# Altium footprint library MCBoard_pcb.PcbLib: 78 footprints (part 3 of 5)
Each footprint in its own frame and in the unit in brackets; x right, y up, seen from the top. Pads: shape width x height; smd on the part's side, far side on the other; paste and mask are expansions set on the pad; w line width, h text height; cw(c..) or ccw(c..) is an arc to the next point about the centre after c.
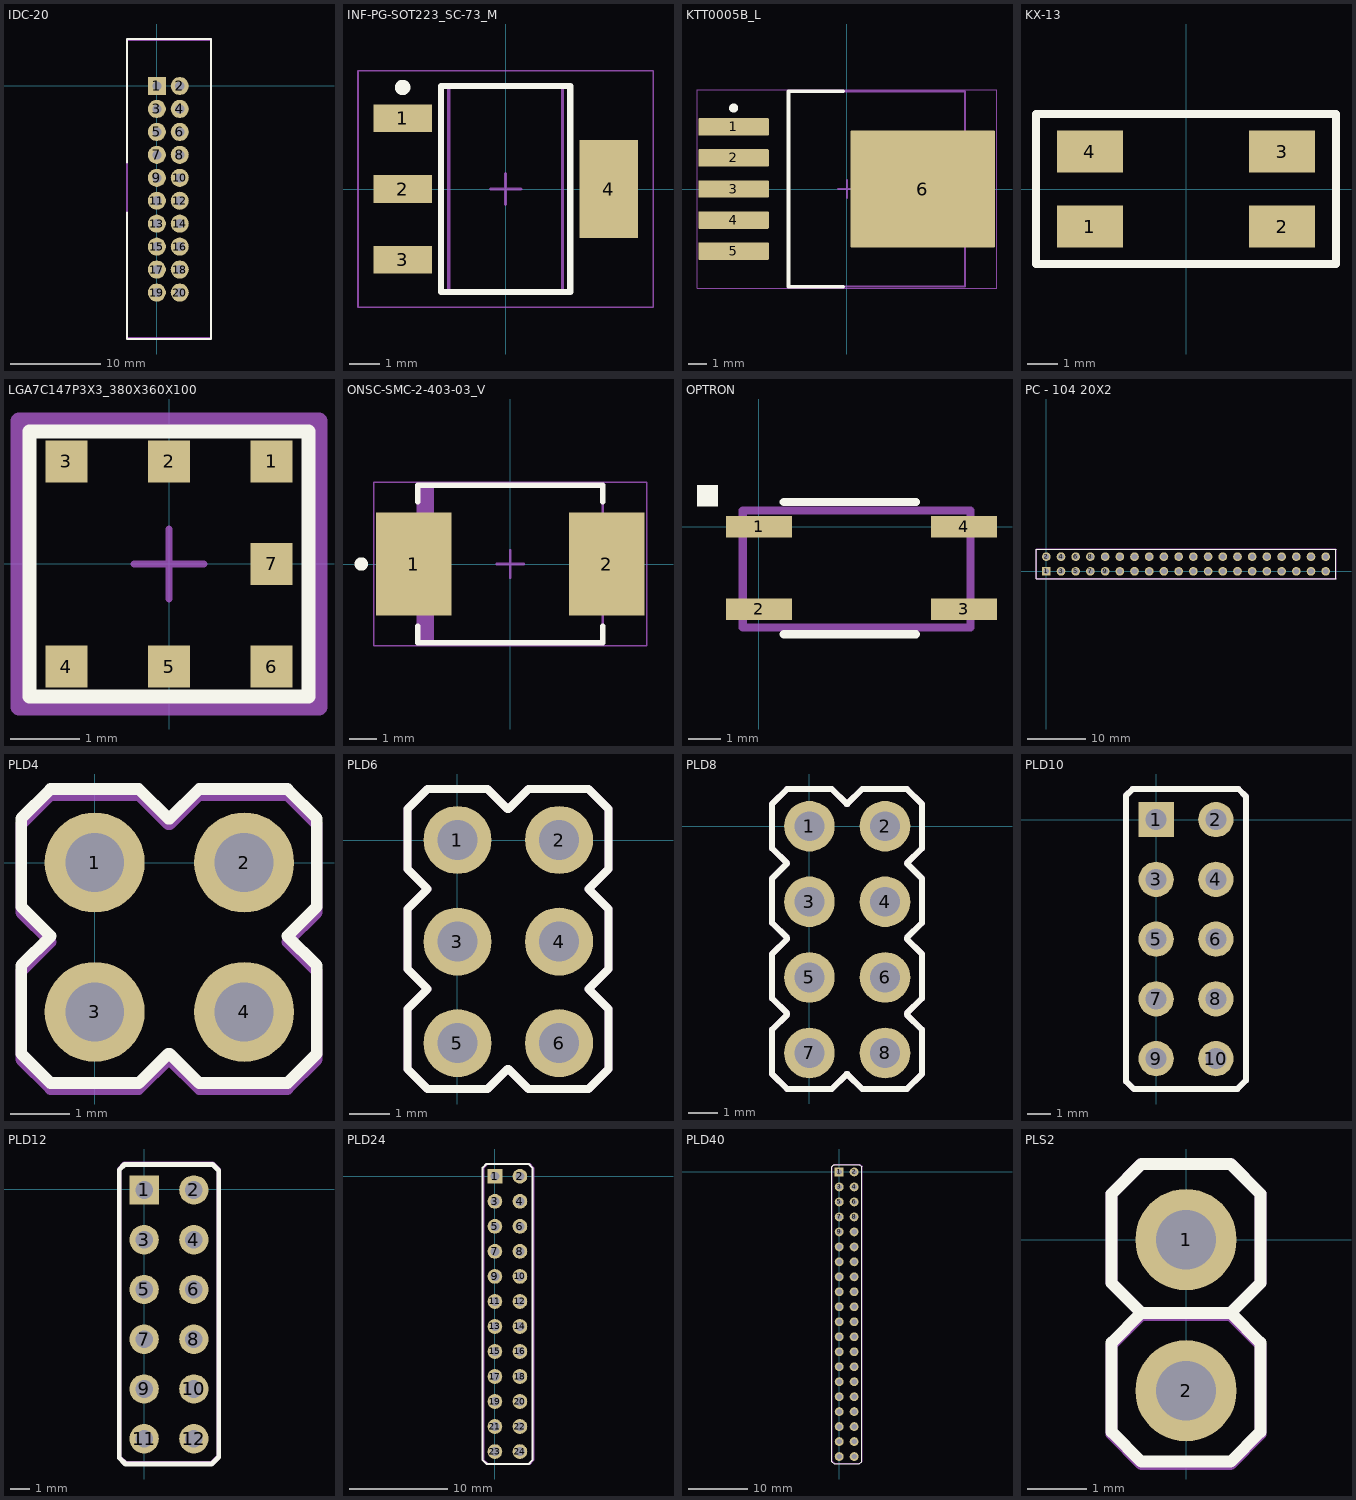
[diagram p2: the footprints below, top view; thin cyan lines are the x and y axes]

## IDC-20 [mm] "IDC-20 Male Connector"
height 9
pads (20):
  rect 2x2 hole 1: 1(0,0)
  round 2 hole 1: 2(2.54,0) 3(0,-2.54) 4(2.54,-2.54) 5(0,-5.08) 6(2.54,-5.08) 7(0,-7.62) 8(2.54,-7.62) 9(0,-10.16) 10(2.54,-10.16) 11(0,-12.7) 12(2.54,-12.7) 13(0,-15.24) 14(2.54,-15.24) 15(0,-17.78) 16(2.54,-17.78) 17(0,-20.32) 18(2.54,-20.32) 19(0,-22.86) 20(2.54,-22.86)
Top Overlay:
  lines w0.2: -3.3,-14 -3.3,-28 6,-28 6,5.2 -3.3,5.2 -3.3,-8.5
Pattern top:
  lines w0.2: -3.3,-27.9 6,-27.9 6,5.2 5.9,5.1 -3.3,5.1 -3.3,-27.9
  text ".Designator" at -3.2,2.3 h2.13
3D body "User Library-BH-10__64BH-20.STEP": height 9.1, standoff -3, extent -3.3,-28 6,5.2

## INF-PG-SOT223_SC-73_M [mm] "SOT223, 4-Leads, Body 6.5x3.5mm, Pitch 2.3mm, IPC Low Density"
height 1.8
pads (4):
  rect 1.9x0.9 smd: 1(-3.35,2.3) 2(-3.35,0) 3(-3.35,-2.3)
  rect 1.9x3.2 smd: 4(3.35,0)
Top Overlay:
  circle w0.25: c-3.35,3.3 r0.125
  lines w0.2: -2.1,-3.35 -2.1,3.35 2.1,3.35 2.1,-3.35 -2.1,-3.35
Mechanical 13:
  lines w0.1: -1.85,-3.35 -1.85,3.35 1.85,3.35 1.85,-3.35 -1.85,-3.35
Mechanical 15:
  lines w0.05: -4.8,-3.85 -4.8,3.85 4.8,3.85 4.8,-3.85 -4.8,-3.85
  lines w0.1: -0.5,0 0.5,0 ; 0,-0.5 0,0.5
3D body: height 1.8, standoff 0.1, extent -1.85,-3.35 1.85,3.35

## KTT0005B_L [mm] "DPAK, 5-Leads, Body 10.65x9.65mm, Pitch 1.7mm, IPC High Density"
height 4.83
pads (6):
  rrect11% 3.85x0.95 smd: 1(-6.2,3.4) 2(-6.2,1.7) 3(-6.2,0) 4(-6.2,-1.7) 5(-6.2,-3.4)
  rrect2% 7.9x6.4 smd: 6(4.15,0)
Top Overlay:
  circle w0.25: c-6.2,4.425 r0.125
  lines w0.2: -0.2,-5.35 -3.2,-5.35 -3.2,5.35 -0.2,5.35
Template:
  text ".Designator" at -1.905,-0.508 h1.3
Mechanical 13:
  lines w0.1: -3.2,-5.325 6.45,-5.325 6.45,5.325 -3.2,5.325 -3.2,-5.325
Mechanical 15:
  lines w0.05: -8.2,-5.425 8.2,-5.425 8.2,5.425 -8.2,5.425 -8.2,-5.425
  lines w0.1: -0.5,0 0.5,0 ; 0,-0.5 0,0.5
3D body: height 4.83, standoff 0, extent -3.2,-5.325 6.45,5.325

## KX-13 [mm]
pads (4):
  rect 2.2x1.4 smd: 1(-3.2,-1.25) 2(3.2,-1.25) 3(3.2,1.25) 4(-3.2,1.25)
Top Overlay:
  lines w0.254: -5,-2.5 5,-2.5 5,2.5 -5,2.5 -5,-2.5
Pattern top:
  lines w0.25: -5,-2.5 -5,2.5 5,2.5 5,-2.5 -5,-2.5
  text ".Designator" at -4.4,3.4 h2.13
3D body "User Library-KX-13 7,37280.STEP": height 1.29, standoff -0.01, extent -3.5,-2.6 3.5,2.4

## LGA7C147P3X3_380X360X100 [mm] "LGA, 7-Leads, Body 3,80x3,60mmx1,00mm, Pitch 1,47mm"
height 1
pads (7):
  rect 0.6x0.6 smd: 1(1.47,1.47) 2(0,1.47) 3(-1.47,1.47) 4(-1.47,-1.47) 5(0,-1.47) 6(1.47,-1.47) 7(1.47,0)
Top Overlay:
  lines w0.2: -2,-1.9 -2,1.9 2,1.9 2,-1.9 -2,-1.9
Pattern top:
  lines w0.1: -0.5,0 0.5,0 ; 0,-0.5 0,0.5
  lines w0.25: -2.15,-2.05 2.15,-2.05 2.15,2.05 -2.15,2.05 -2.15,-2.05
  text ".Designator" at -1.2,3 h2.13
3D body "LGA7C147P3X3_380X360X100.step": height 1, standoff 0, extent -1.95,-1.85 1.95,1.85

## ONSC-SMC-2-403-03_V [mil] "Molded, 2-Leads, Body 6.86x5.84mm"
height 99.02
pads (2):
  rect 110x150 smd: 1(-140.49,0) 2(140.49,0)
Top Overlay:
  circle w9.84: c-217.15,0 r4.92
  lines w7.87: -135.04,-90.75 -135.04,-114.96 135.04,-114.96 135.04,-90.75 ; -135.04,90.75 -135.04,114.96 135.04,114.96 135.04,90.75
Mechanical 13:
  rectangle: -135.45,-114.96 -111.25,114.96
  lines w3.94: -135.04,-114.96 135.04,-114.96 135.04,114.96 -135.04,114.96 -135.04,-114.96
Mechanical 15:
  lines w1.97: -199.43,-118.9 199.43,-118.9 199.43,118.9 -199.43,118.9 -199.43,-118.9
  lines w3.94: -19.68,0 19.69,0 ; 0,-19.68 0,19.68
3D body: height 99.02, standoff 1.97, extent -135.04,-114.96 135.04,114.96

## OPTRON [mil]
pads (4):
  rect 80x26 smd: 1(0,0) 2(0,-100) 3(248.03,-100) 4(248.03,0)
Top Overlay:
  region: -75,25 -50,25 -50,50 -75,50
  lines w10: 30,-130 190,-130 ; 30,30 190,30
Pattern top:
  lines w9.84: -19.68,-122.05 -19.68,19.68 255.91,19.68 255.91,-122.05 -19.68,-122.05
  text ".Designator" at -11.81,66.93 h83.86
3D body "User Library-HCPL-181-1.STEP": height 78.74, standoff -3.96, extent -19.68,-122.05 255.91,19.69

## PC - 104 20X2 [mm] "Connector; Header; 20x2 Position"
height 11.1
pads (40):
  rect 1.5x1.5 hole 1: 1(0,0)
  round 1.5 hole 1: 2(0,2.54) 3(2.54,0) 4(2.54,2.54) 5(5.08,0) 6(5.08,2.54) 7(7.62,0) 8(7.62,2.54) 9(10.16,0) 10(10.16,2.54) 11(12.7,0) 12(12.7,2.54) 13(15.24,0) 14(15.24,2.54) 15(17.78,0) 16(17.78,2.54) 17(20.32,0) 18(20.32,2.54) 19(22.86,0) 20(22.86,2.54) 21(25.4,0) 22(25.4,2.54) 23(27.94,0) 24(27.94,2.54) 25(30.48,0) 26(30.48,2.54) 27(33.02,0) 28(33.02,2.54) 29(35.56,0) 30(35.56,2.54) 31(38.1,0) 32(38.1,2.54) 33(40.64,0) 34(40.64,2.54) 35(43.18,0) 36(43.18,2.54) 37(45.72,0) 38(45.72,2.54) 39(48.26,0) 40(48.26,2.54)
Top Overlay:
  lines w0.2: -1.78,-1.27 50.04,-1.27 ; -1.78,3.81 50.04,3.81 ; -1.778,-1.27 -1.778,3.81 ; 50.038,-1.27 50.038,3.81
Bottom Overlay:
  lines w0.2: -1.78,-1.27 50.04,-1.27 ; -1.78,3.81 50.04,3.81 ; -1.778,-1.27 -1.778,3.81 ; 50.038,-1.27 50.038,3.81
Pattern top:
  lines w0.25: -1.78,-1.27 -1.78,3.81 50.038,3.81 50.038,-1.27 -1.78,-1.27
  text ".Designator" at 18.2,5.8 h2.13
3D body "pc104-40 тип 2.STEP": height 11.05, standoff -12.2, extent -1.52,-1.205 49.78,3.745

## PLD4 [mm]
pads (4):
  round 1.7 hole 1 paste+0: 1(0,0) 2(2.54,0) 3(0,-2.54) 4(2.54,-2.54)
Top Overlay:
  lines w0.2: 1.25,-3.25 0.75,-3.75 -0.75,-3.75 -1.25,-3.25 -1.25,-1.75 -0.75,-1.25 -1.25,-0.75 -1.25,0.75 -0.75,1.25 0.75,1.25 1.25,0.75 ; 1.275,-3.25 1.775,-3.75 3.275,-3.75 3.775,-3.25 3.775,-1.75 3.275,-1.25 3.775,-0.75 3.775,0.75 3.275,1.25 1.775,1.25 1.275,0.75
Pattern top:
  lines w0.2: 1.25,-3.35 0.75,-3.85 -0.75,-3.85 -1.25,-3.35 -1.25,-1.85 -0.75,-1.35 -1.25,-0.85 -1.25,0.65 -0.75,1.15 0.75,1.15 1.25,0.65 ; 1.275,-3.35 1.775,-3.85 3.275,-3.85 3.775,-3.35 3.775,-1.85 3.275,-1.35 3.775,-0.85 3.775,0.65 3.275,1.15 1.775,1.15 1.275,0.65
  text ".Designator" at -2.9,1.8 h2.13
3D body "User Library-PLS-1.STEP": height 8.44, standoff -3, extent 1.27,-3.81 3.81,-1.27
3D body "User Library-PLS-1.STEP": height 8.44, standoff -3, extent -1.27,-3.81 1.27,-1.27
3D body "User Library-PLS-1.STEP": height 8.44, standoff -3, extent 1.27,-1.27 3.81,1.27
3D body "User Library-PLS-1.STEP": height 8.44, standoff -3, extent -1.27,-1.27 1.27,1.27

## PLD6 [mm]
pads (6):
  round 1.7 hole 1 paste+0: 1(0,0) 2(2.54,0) 3(0,-2.54) 4(2.54,-2.54) 5(0,-5.08) 6(2.54,-5.08)
Top Overlay:
  lines w0.2: 1.25,-5.725 0.75,-6.225 -0.75,-6.225 -1.25,-5.725 -1.25,-4.225 -0.75,-3.725 -1.25,-3.225 -1.25,-1.725 -0.75,-1.225 -1.25,-0.725 -1.25,0.775 -0.75,1.275 0.75,1.275 1.25,0.775 ; 1.275,-5.725 1.775,-6.225 3.275,-6.225 3.775,-5.725 3.775,-4.225 3.275,-3.725 3.775,-3.225 3.775,-1.725 3.275,-1.225 3.775,-0.725 3.775,0.775 3.275,1.275 1.775,1.275 1.275,0.775
Pattern top:
  lines w0.2: 1.25,-5.725 0.75,-6.225 -0.75,-6.225 -1.25,-5.725 -1.25,-4.225 -0.75,-3.725 -1.25,-3.225 -1.25,-1.725 -0.75,-1.225 -1.25,-0.725 -1.25,0.775 -0.75,1.275 0.75,1.275 1.25,0.775 ; 1.275,-5.725 1.775,-6.225 3.275,-6.225 3.775,-5.725 3.775,-4.225 3.275,-3.725 3.775,-3.225 3.775,-1.725 3.275,-1.225 3.775,-0.725 3.775,0.775 3.275,1.275 1.775,1.275 1.275,0.775
  text ".Designator" at -3.1,2 h2.13
3D body "User Library-PLS-1.STEP": height 8.44, standoff -3, extent -1.27,-6.35 1.27,-3.81
3D body "User Library-PLS-1.STEP": height 8.44, standoff -3, extent 1.27,-6.35 3.81,-3.81
3D body "User Library-PLS-1.STEP": height 8.44, standoff -3, extent 1.27,-3.81 3.81,-1.27
3D body "User Library-PLS-1.STEP": height 8.44, standoff -3, extent -1.27,-3.81 1.27,-1.27
3D body "User Library-PLS-1.STEP": height 8.44, standoff -3, extent 1.27,-1.27 3.81,1.27
3D body "User Library-PLS-1.STEP": height 8.44, standoff -3, extent -1.27,-1.27 1.27,1.27

## PLD8 [mm]
pads (8):
  round 1.7 hole 1 paste+0: 1(0,0) 2(2.54,0) 3(0,-2.54) 4(2.54,-2.54) 5(0,-5.08) 6(2.54,-5.08) 7(0,-7.62) 8(2.54,-7.62)
Top Overlay:
  lines w0.2: -0.75,-6.33 -1.25,-6.83 -1.25,-8.33 -0.75,-8.83 0.75,-8.83 1.25,-8.33 ; -0.75,-6.29 -1.25,-5.79 -1.25,-4.29 -0.75,-3.79 ; -0.75,-3.75 -1.25,-3.25 -1.25,-1.75 -0.75,-1.25 -1.25,-0.75 -1.25,0.75 -0.75,1.25 0.75,1.25 1.25,0.75 ; 1.275,-8.33 1.775,-8.83 3.275,-8.83 3.775,-8.33 3.775,-6.83 3.275,-6.33 ; 1.275,0.75 1.775,1.25 3.275,1.25 3.775,0.75 3.775,-0.75 3.275,-1.25 3.775,-1.75 3.775,-3.25 3.275,-3.75 ; 3.275,-6.29 3.775,-5.79 3.775,-4.29 3.275,-3.79
Pattern top:
  lines w0.2: -0.75,-6.33 -1.25,-6.83 -1.25,-8.33 -0.75,-8.83 0.75,-8.83 1.25,-8.33 ; -0.75,-6.29 -1.25,-5.79 -1.25,-4.29 -0.75,-3.79 ; -0.75,-3.75 -1.25,-3.25 -1.25,-1.75 -0.75,-1.25 -1.25,-0.75 -1.25,0.75 -0.75,1.25 0.75,1.25 1.25,0.75 ; 1.275,-8.33 1.775,-8.83 3.275,-8.83 3.775,-8.33 3.775,-6.83 3.275,-6.33 ; 1.275,0.75 1.775,1.25 3.275,1.25 3.775,0.75 3.775,-0.75 3.275,-1.25 3.775,-1.75 3.775,-3.25 3.275,-3.75 ; 3.275,-6.29 3.775,-5.79 3.775,-4.29 3.275,-3.79
  text ".Designator" at -2.9,2 h2.13
3D body "User Library-PLS-1.STEP": height 8.44, standoff -3, extent -1.27,-8.89 1.27,-6.35
3D body "User Library-PLS-1.STEP": height 8.44, standoff -3, extent 1.27,-8.89 3.81,-6.35
3D body "User Library-PLS-1.STEP": height 8.44, standoff -3, extent -1.27,-6.35 1.27,-3.81
3D body "User Library-PLS-1.STEP": height 8.44, standoff -3, extent 1.27,-6.35 3.81,-3.81
3D body "User Library-PLS-1.STEP": height 8.44, standoff -3, extent 1.27,-3.81 3.81,-1.27
3D body "User Library-PLS-1.STEP": height 8.44, standoff -3, extent -1.27,-3.81 1.27,-1.27
3D body "User Library-PLS-1.STEP": height 8.44, standoff -3, extent 1.27,-1.27 3.81,1.27
3D body "User Library-PLS-1.STEP": height 8.44, standoff -3, extent -1.27,-1.27 1.27,1.27

## PLD10 [mm]
pads (10):
  rect 1.5x1.5 hole 0.9: 1(0,0)
  round 1.5 hole 0.9: 2(2.54,0) 3(0,-2.54) 4(2.54,-2.54) 5(0,-5.08) 6(2.54,-5.08) 7(0,-7.62) 8(2.54,-7.62) 9(0,-10.16) 10(2.54,-10.16)
Top Overlay:
  lines w0.254: -1.27,-11.13 -1.27,1.03 -1,1.3 3.5,1.3 3.81,0.99 3.81,-11.09 3.45,-11.45 -0.95,-11.45 -1.27,-11.13
Pattern top:
  lines w0.254: -1.27,-11.13 -1.27,1.03 -1,1.3 3.5,1.3 3.81,0.99 3.81,-11.09 3.45,-11.45 -0.95,-11.45 -1.27,-11.13
  text ".Designator" at -3.1,2.1 h2.13
3D body "User Library-PLS-1.STEP": height 8.44, standoff -3, extent -1.27,-1.27 1.27,1.27
3D body "User Library-PLS-1.STEP": height 8.44, standoff -3, extent 1.27,-1.27 3.81,1.27
3D body "User Library-PLS-1.STEP": height 8.44, standoff -3, extent -1.27,-3.81 1.27,-1.27
3D body "User Library-PLS-1.STEP": height 8.44, standoff -3, extent 1.27,-3.81 3.81,-1.27
3D body "User Library-PLS-1.STEP": height 8.44, standoff -3, extent -1.27,-6.35 1.27,-3.81
3D body "User Library-PLS-1.STEP": height 8.44, standoff -3, extent 1.27,-6.35 3.81,-3.81
3D body "User Library-PLS-1.STEP": height 8.44, standoff -3, extent 1.27,-8.89 3.81,-6.35
3D body "User Library-PLS-1.STEP": height 8.44, standoff -3, extent -1.27,-8.89 1.27,-6.35
3D body "User Library-PLS-1.STEP": height 8.44, standoff -3, extent -1.27,-11.43 1.27,-8.89
3D body "User Library-PLS-1.STEP": height 8.44, standoff -3, extent 1.27,-11.43 3.81,-8.89

## PLD12 [mm]
pads (12):
  rect 1.5x1.5 hole 0.9: 1(0,-0.025)
  round 1.5 hole 0.9: 2(2.54,-0.025) 3(0,-2.565) 4(2.54,-2.565) 5(0,-5.105) 6(2.54,-5.105) 7(0,-7.645) 8(2.54,-7.645) 9(0,-10.185) 10(2.54,-10.185) 11(0,-12.725) 12(2.54,-12.725)
Top Overlay:
  lines w0.254: -1.27,-13.7 -1.27,1.005 -1,1.275 3.5,1.275 3.81,0.965 3.81,-13.65 ; -1.27,-13.695 -0.95,-14.015 3.45,-14.015 3.81,-13.655
Pattern top:
  lines w0.254: -1.27,-13.675 -1.27,1.03 -1,1.3 3.5,1.3 3.81,0.99 3.81,-13.625 ; -1.27,-13.67 -0.95,-13.99 3.45,-13.99 3.81,-13.63
  text ".Designator" at -2.8,2.2 h2.13
3D body "User Library-PLS-1.STEP": height 8.44, standoff -3, extent 1.27,-13.995 3.81,-11.455
3D body "User Library-PLS-1.STEP": height 8.44, standoff -3, extent -1.27,-13.995 1.27,-11.455
3D body "User Library-PLS-1.STEP": height 8.44, standoff -3, extent -1.27,-1.295 1.27,1.245
3D body "User Library-PLS-1.STEP": height 8.44, standoff -3, extent 1.27,-1.295 3.81,1.245
3D body "User Library-PLS-1.STEP": height 8.44, standoff -3, extent -1.27,-3.835 1.27,-1.295
3D body "User Library-PLS-1.STEP": height 8.44, standoff -3, extent 1.27,-3.835 3.81,-1.295
3D body "User Library-PLS-1.STEP": height 8.44, standoff -3, extent -1.27,-6.375 1.27,-3.835
3D body "User Library-PLS-1.STEP": height 8.44, standoff -3, extent 1.27,-6.375 3.81,-3.835
3D body "User Library-PLS-1.STEP": height 8.44, standoff -3, extent 1.27,-8.915 3.81,-6.375
3D body "User Library-PLS-1.STEP": height 8.44, standoff -3, extent -1.27,-8.915 1.27,-6.375
3D body "User Library-PLS-1.STEP": height 8.44, standoff -3, extent -1.27,-11.455 1.27,-8.915
3D body "User Library-PLS-1.STEP": height 8.44, standoff -3, extent 1.27,-11.455 3.81,-8.915

## PLD24 [mm]
pads (24):
  rect 1.5x1.5 hole 0.9: 1(0,0)
  round 1.5 hole 0.9: 2(2.54,0) 3(0,-2.54) 4(2.54,-2.54) 5(0,-5.08) 6(2.54,-5.08) 7(0,-7.62) 8(2.54,-7.62) 9(0,-10.16) 10(2.54,-10.16) 11(0,-12.7) 12(2.54,-12.7) 13(0,-15.24) 14(2.54,-15.24) 15(0,-17.78) 16(2.54,-17.78) 17(0,-20.32) 18(2.54,-20.32) 19(0,-22.86) 20(2.54,-22.86) 21(0,-25.4) 22(2.54,-25.4) 23(0,-27.94) 24(2.54,-27.94)
Top Overlay:
  lines w0.2: -1.25,-28.8 -0.85,-29.2 3.425,-29.2 3.81,-28.815 3.81,0.865 3.425,1.25 -0.875,1.25 -1.25,0.875 -1.25,-28.8
Pattern top:
  lines w0.2: -1.15,-28.8 -0.75,-29.2 3.525,-29.2 3.91,-28.815 3.91,0.865 3.525,1.25 -0.775,1.25 -1.15,0.875 -1.15,-28.8
  text ".Designator" at -3,2.3 h2.13
3D body "User Library-PLS-1.STEP": height 8.44, standoff -3, extent -1.27,-1.27 1.27,1.27
3D body "User Library-PLS-1.STEP": height 8.44, standoff -3, extent 1.27,-1.27 3.81,1.27
3D body "User Library-PLS-1.STEP": height 8.44, standoff -3, extent -1.27,-3.81 1.27,-1.27
3D body "User Library-PLS-1.STEP": height 8.44, standoff -3, extent 1.27,-3.81 3.81,-1.27
3D body "User Library-PLS-1.STEP": height 8.44, standoff -3, extent -1.27,-6.35 1.27,-3.81
3D body "User Library-PLS-1.STEP": height 8.44, standoff -3, extent 1.27,-6.35 3.81,-3.81
3D body "User Library-PLS-1.STEP": height 8.44, standoff -3, extent -1.27,-8.89 1.27,-6.35
3D body "User Library-PLS-1.STEP": height 8.44, standoff -3, extent 1.27,-8.89 3.81,-6.35
3D body "User Library-PLS-1.STEP": height 8.44, standoff -3, extent -1.27,-11.43 1.27,-8.89
3D body "User Library-PLS-1.STEP": height 8.44, standoff -3, extent 1.27,-11.43 3.81,-8.89
3D body "User Library-PLS-1.STEP": height 8.44, standoff -3, extent -1.27,-13.97 1.27,-11.43
3D body "User Library-PLS-1.STEP": height 8.44, standoff -3, extent 1.27,-13.97 3.81,-11.43
3D body "User Library-PLS-1.STEP": height 8.44, standoff -3, extent -1.27,-16.51 1.27,-13.97
3D body "User Library-PLS-1.STEP": height 8.44, standoff -3, extent 1.27,-16.51 3.81,-13.97
3D body "User Library-PLS-1.STEP": height 8.44, standoff -3, extent -1.27,-19.05 1.27,-16.51
3D body "User Library-PLS-1.STEP": height 8.44, standoff -3, extent 1.27,-19.05 3.81,-16.51
3D body "User Library-PLS-1.STEP": height 8.44, standoff -3, extent -1.27,-21.59 1.27,-19.05
3D body "User Library-PLS-1.STEP": height 8.44, standoff -3, extent 1.27,-21.59 3.81,-19.05
3D body "User Library-PLS-1.STEP": height 8.44, standoff -3, extent -1.27,-24.13 1.27,-21.59
3D body "User Library-PLS-1.STEP": height 8.44, standoff -3, extent 1.27,-24.13 3.81,-21.59
3D body "User Library-PLS-1.STEP": height 8.44, standoff -3, extent -1.27,-26.67 1.27,-24.13
3D body "User Library-PLS-1.STEP": height 8.44, standoff -3, extent 1.27,-26.67 3.81,-24.13
3D body "User Library-PLS-1.STEP": height 8.44, standoff -3, extent -1.27,-29.21 1.27,-26.67
3D body "User Library-PLS-1.STEP": height 8.44, standoff -3, extent 1.27,-29.21 3.81,-26.67

## PLD40 [mm]
pads (40):
  rect 1.5x1.5 hole 0.9: 1(0,0)
  round 1.5 hole 0.9: 2(2.54,0) 3(0,-2.54) 4(2.54,-2.54) 5(0,-5.08) 6(2.54,-5.08) 7(0,-7.62) 8(2.54,-7.62) 9(0,-10.16) 10(2.54,-10.16) 11(0,-12.7) 12(2.54,-12.7) 13(0,-15.24) 14(2.54,-15.24) 15(0,-17.78) 16(2.54,-17.78) 17(0,-20.32) 18(2.54,-20.32) 19(0,-22.86) 20(2.54,-22.86) 21(0,-25.4) 22(2.54,-25.4) 23(0,-27.94) 24(2.54,-27.94) 25(0,-30.475) 26(2.54,-30.475) 27(0,-33.015) 28(2.54,-33.015) 29(0,-35.555) 30(2.54,-35.555) 31(0,-38.095) 32(2.54,-38.095) 33(0,-40.635) 34(2.54,-40.635) 35(0,-43.175) 36(2.54,-43.175) 37(0,-45.715) 38(2.54,-45.715) 39(0,-48.255) 40(2.54,-48.255)
Top Overlay:
  lines w0.2: -1.25,-49.115 -0.85,-49.515 3.425,-49.515 3.81,-49.13 3.81,-28.815 3.81,0.865 3.425,1.25 -0.875,1.25 -1.25,0.875 -1.25,-28.8 -1.25,-49.115
Pattern top:
  lines w0.2: -1.15,-49.015 -0.75,-49.415 3.525,-49.415 3.91,-49.03 3.91,-28.715 3.91,0.965 3.525,1.35 -0.775,1.35 -1.15,0.975 -1.15,-28.7 -1.15,-49.015
  text ".Designator" at -3.1,2.3 h2.13
3D body "User Library-PLS-1.STEP": height 8.44, standoff -3, extent 1.27,-29.21 3.81,-26.67
3D body "User Library-PLS-1.STEP": height 8.44, standoff -3, extent -1.27,-29.21 1.27,-26.67
3D body "User Library-PLS-1.STEP": height 8.44, standoff -3, extent 1.27,-26.67 3.81,-24.13
3D body "User Library-PLS-1.STEP": height 8.44, standoff -3, extent -1.27,-26.67 1.27,-24.13
3D body "User Library-PLS-1.STEP": height 8.44, standoff -3, extent 1.27,-24.13 3.81,-21.59
3D body "User Library-PLS-1.STEP": height 8.44, standoff -3, extent -1.27,-24.13 1.27,-21.59
3D body "User Library-PLS-1.STEP": height 8.44, standoff -3, extent 1.27,-21.59 3.81,-19.05
3D body "User Library-PLS-1.STEP": height 8.44, standoff -3, extent -1.27,-21.59 1.27,-19.05
3D body "User Library-PLS-1.STEP": height 8.44, standoff -3, extent 1.27,-19.05 3.81,-16.51
3D body "User Library-PLS-1.STEP": height 8.44, standoff -3, extent -1.27,-19.05 1.27,-16.51
3D body "User Library-PLS-1.STEP": height 8.44, standoff -3, extent 1.27,-16.51 3.81,-13.97
3D body "User Library-PLS-1.STEP": height 8.44, standoff -3, extent -1.27,-16.51 1.27,-13.97
3D body "User Library-PLS-1.STEP": height 8.44, standoff -3, extent 1.27,-13.97 3.81,-11.43
3D body "User Library-PLS-1.STEP": height 8.44, standoff -3, extent -1.27,-13.97 1.27,-11.43
3D body "User Library-PLS-1.STEP": height 8.44, standoff -3, extent 1.27,-11.43 3.81,-8.89
3D body "User Library-PLS-1.STEP": height 8.44, standoff -3, extent -1.27,-11.43 1.27,-8.89
3D body "User Library-PLS-1.STEP": height 8.44, standoff -3, extent 1.27,-8.89 3.81,-6.35
3D body "User Library-PLS-1.STEP": height 8.44, standoff -3, extent -1.27,-8.89 1.27,-6.35
3D body "User Library-PLS-1.STEP": height 8.44, standoff -3, extent 1.27,-6.35 3.81,-3.81
3D body "User Library-PLS-1.STEP": height 8.44, standoff -3, extent -1.27,-6.35 1.27,-3.81
3D body "User Library-PLS-1.STEP": height 8.44, standoff -3, extent 1.27,-3.81 3.81,-1.27
3D body "User Library-PLS-1.STEP": height 8.44, standoff -3, extent -1.27,-3.81 1.27,-1.27
3D body "User Library-PLS-1.STEP": height 8.44, standoff -3, extent 1.27,-1.27 3.81,1.27
3D body "User Library-PLS-1.STEP": height 8.44, standoff -3, extent -1.27,-1.27 1.27,1.27
3D body "User Library-PLS-1.STEP": height 8.44, standoff -3, extent -1.27,-31.745 1.27,-29.205
3D body "User Library-PLS-1.STEP": height 8.44, standoff -3, extent 1.27,-31.745 3.81,-29.205
3D body "User Library-PLS-1.STEP": height 8.44, standoff -3, extent -1.27,-34.285 1.27,-31.745
3D body "User Library-PLS-1.STEP": height 8.44, standoff -3, extent 1.27,-34.285 3.81,-31.745
3D body "User Library-PLS-1.STEP": height 8.44, standoff -3, extent -1.27,-36.825 1.27,-34.285
3D body "User Library-PLS-1.STEP": height 8.44, standoff -3, extent 1.27,-36.825 3.81,-34.285
3D body "User Library-PLS-1.STEP": height 8.44, standoff -3, extent -1.27,-39.365 1.27,-36.825
3D body "User Library-PLS-1.STEP": height 8.44, standoff -3, extent 1.27,-39.365 3.81,-36.825
3D body "User Library-PLS-1.STEP": height 8.44, standoff -3, extent -1.27,-41.905 1.27,-39.365
3D body "User Library-PLS-1.STEP": height 8.44, standoff -3, extent 1.27,-41.905 3.81,-39.365
3D body "User Library-PLS-1.STEP": height 8.44, standoff -3, extent -1.27,-44.445 1.27,-41.905
3D body "User Library-PLS-1.STEP": height 8.44, standoff -3, extent 1.27,-44.445 3.81,-41.905
3D body "User Library-PLS-1.STEP": height 8.44, standoff -3, extent -1.27,-46.985 1.27,-44.445
3D body "User Library-PLS-1.STEP": height 8.44, standoff -3, extent 1.27,-46.985 3.81,-44.445
3D body "User Library-PLS-1.STEP": height 8.44, standoff -3, extent -1.27,-49.525 1.27,-46.985
3D body "User Library-PLS-1.STEP": height 8.44, standoff -3, extent 1.27,-49.525 3.81,-46.985

## PLS2 [mm]
pads (2):
  round 1.7 hole 1 paste+0: 1(0,0) 2(0,-2.54)
Top Overlay:
  lines w0.2: -0.75,-1.23 -1.25,-0.73 -1.25,0.77 -0.75,1.27 0.75,1.27 1.25,0.77 1.25,-0.73 0.75,-1.23 ; -0.75,-1.23 -1.25,-1.73 -1.25,-3.23 -0.75,-3.73 0.75,-3.73 1.25,-3.23 1.25,-1.73 0.75,-1.23 ; -0.75,-1.23 0.75,-1.23
Pattern top:
  lines w0.2: -1.25,-3.27 -1.25,-1.77 -0.75,-1.27 0.75,-1.27 1.25,-1.77 1.25,-3.27 0.75,-3.77 -0.75,-3.77 -1.25,-3.27 ; -1.25,-0.73 -1.25,0.77 -0.75,1.27 0.75,1.27 1.25,0.77 1.25,-0.73 0.75,-1.23 -0.75,-1.23 -1.25,-0.73
  text ".Designator" at -4.2,1.9 h2.13
3D body "User Library-PLS-1.STEP": height 8.44, standoff -3, extent -1.27,-1.27 1.27,1.27
3D body "User Library-PLS-1.STEP": height 8.44, standoff -3, extent -1.27,-3.81 1.27,-1.27